# Altium footprint library USB to RS232.PcbLib: 20 footprints (part 1 of 2)
Each footprint in its own frame and in the unit in brackets; x right, y up, seen from the top. Pads: shape width x height; smd on the part's side, far side on the other; paste and mask are expansions set on the pad; w line width, h text height; cw(c..) or ccw(c..) is an arc to the next point about the centre after c.
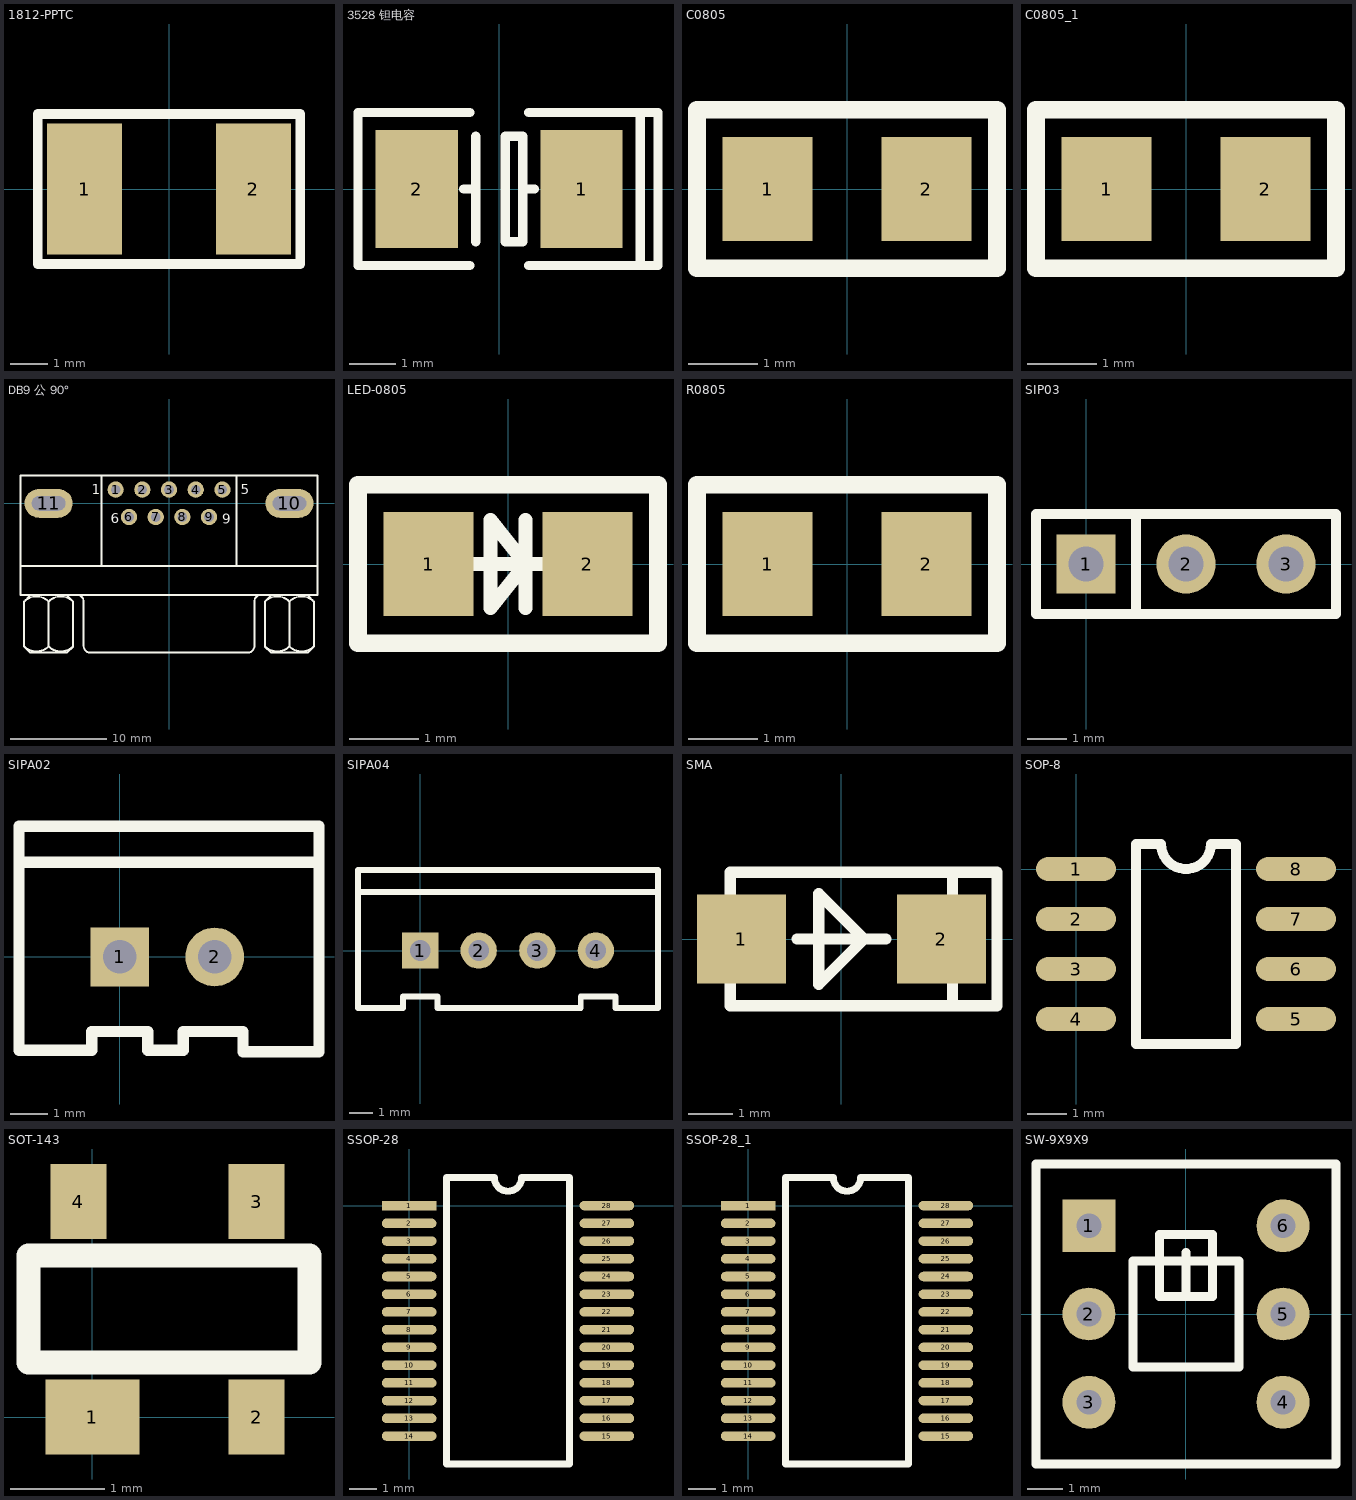
[diagram p0: the footprints below, top view; thin cyan lines are the x and y axes]

## 1812-PPTC [mm]
height 1
pads (2):
  rect 2x3.5 smd: 1(-2.25,0) 2(2.25,0)
Top Overlay:
  lines w0.254: -3.5,-2 3.5,-2 3.5,2 -3.5,2 -3.5,-2
3D body "User Library-fuse1812.STEP": height 1.32, standoff 0, extent -2.41,-1.61 2.41,1.61

## 3528 钽电容 [mil]
height 118.11
pads (2):
  rect 70x100 smd: 1(70,0) 2(-70,0)
Top Overlay:
  lines w8: -30,0 -20,0 ; -25,-65 -120,-65 -120,65 -25,65 ; -20,-45 -20,45 ; 20,0 30,0 ; 25,-65 120,-65 ; 25,65 120,65 ; 120,-65 120,65 ; 120,-65 135,-65 135,65 120,65 ; 5,-45 5,45 20,45 20,-45 5,-45
3D body "3528.STEP": height 82.22, standoff -0.46, extent -72.65,-55.51 72.64,55.51

## C0805 [mm]
height 0.5
pads (2):
  rect 1.3x1.5 smd: 1(-1.143,0) 2(1.143,0)
Top Overlay:
  lines w0.254: -2.159,-1.143 2.159,-1.143 2.159,0.508 2.159,1.143 -2.159,1.143 -2.159,0.635 -2.159,-1.143
3D body "User Library-Chip Cap_MLCC_0805 (2012)_A.STEP": height 0.6, standoff 0, extent -1,-0.625 1,0.625

## C0805_1 [mm]
height 0.5
pads (2):
  rect 1.3x1.5 smd: 1(-1.143,0) 2(1.143,0)
Top Overlay:
  lines w0.254: -2.159,-1.143 2.159,-1.143 2.159,0.508 2.159,1.143 -2.159,1.143 -2.159,0.635 -2.159,-1.143
3D body "User Library-Chip Cap_MLCC_0805 (2012)_A.STEP": height 0.6, standoff 0, extent -1,-0.625 1,0.625

## DB9 公 90° [mm]
height 12.5
pads (11):
  round 1.69 hole 1: 1(-5.54,1.42) 2(-2.77,1.42) 3(0,1.42) 4(2.77,1.42) 5(5.54,1.42) 6(-4.155,-1.42) 7(-1.385,-1.42) 8(1.385,-1.42) 9(4.155,-1.42)
  oval 5x3 hole 1.5 slot 3.5 at 0 deg: 10(12.495,0) 11(-12.495,0)
Top Overlay:
  lines w0.2: -15.4,-6.5 15.4,-6.5 ; -15.042,-14.865 -14.407,-15.5 -10.597,-15.5 -9.962,-14.865 ; -15.042,-14.85 -15.042,-10.199 -14.407,-9.564 ; -15.042,-13.798 -15.042,-13.586 ; -12.502,-14.85 -12.502,-10.199 ; -10.597,-9.564 -9.962,-10.199 -9.962,-14.85 ; -9.56,-9.505 cw(c-9.56,-10.2) -8.865,-10.2 -8.865,-14.8 ; -8.86,-14.805 ccw(c-8.165,-14.805) -8.165,-15.5 8.165,-15.5 ccw(c8.165,-14.805) 8.86,-14.805 ; -7,-6.5 -7,2.9 ; 7,-6.5 7,2.9 ; 8.865,-14.8 8.865,-10.2 cw(c9.56,-10.2) 9.56,-9.505 ; 9.958,-14.865 10.593,-15.5 14.403,-15.5 15.038,-14.865 ; 9.958,-14.85 9.958,-10.199 10.593,-9.564 ; 9.958,-13.798 9.958,-13.586 ; 12.498,-14.85 12.498,-10.199 ; 14.403,-9.564 15.038,-10.199 15.038,-14.85 ; -15.4,-9.5 -15.4,2.9 15.4,2.9 15.4,-9.5 -15.4,-9.5
  lines w0.203: -15.044,-10.197 cw(c-13.772,-11.469) -12.5,-10.197 ; -15.042,-14.85 ccw(c-13.77,-13.578) -12.498,-14.85 ; -12.507,-14.85 ccw(c-11.234,-13.578) -9.962,-14.85 ; -12.504,-10.197 cw(c-11.232,-11.469) -9.96,-10.197 ; 9.956,-10.197 cw(c11.228,-11.469) 12.5,-10.197 ; 9.958,-14.85 ccw(c11.23,-13.578) 12.502,-14.85 ; 12.493,-14.85 ccw(c13.766,-13.578) 15.038,-14.85 ; 12.496,-10.197 cw(c13.768,-11.469) 15.04,-10.197
  text "6" at -6.04,-2.08 h1.02
  text "1" at -8.04,0.92 h1.02
  text "5" at 7.46,0.92 h1.02
  text "9" at 5.54,-2.13 h1.02
3D body "DRB-9M.STEP": height 12.75, standoff -3.65, extent -15.25,-14.525 15.25,3.175

## LED-0805 [mm]
pads (2):
  rect 1.3x1.5 smd: 1(-1.143,0) 2(1.143,0)
Top Overlay:
  lines w0.203: -0.508,0 0.508,0 ; 0.254,-0.635 0.254,0.635 ; -0.254,-0.635 0.254,0 -0.254,0.635 -0.254,-0.635
  lines w0.254: -2.159,-1.143 2.159,-1.143 2.159,1.143 -2.159,1.143 -2.159,-1.143
3D body "User Library-LED SMD0805.STEP": height 0.85, standoff 0.01, extent -1.042,-0.453 1.021,0.453

## R0805 [mm]
height 0.5
pads (2):
  rect 1.3x1.5 smd: 1(-1.143,0) 2(1.143,0)
Top Overlay:
  lines w0.254: -2.159,-1.143 -2.159,0.635 -2.159,1.143 2.159,1.143 2.159,0.508 2.159,-1.143 -2.159,-1.143
3D body "R0805.STEP": height 0.55, standoff 0, extent -1,-0.63 1,0.63

## SIP03 [mm]
pads (3):
  rect 1.5x1.5 hole 0.9: 1(0,0)
  round 1.5 hole 0.9: 2(2.54,0) 3(5.08,0)
Top Overlay:
  lines w0.254: 1.27,-1.27 1.27,1.27 ; -1.27,-1.27 6.35,-1.27 6.35,1.27 -1.27,1.27 -1.27,-1.27
3D body "1001-3.STEP": height 8.54, standoff -3, extent -1.27,-1.27 6.35,1.27

## SIPA02 [mil]
pads (2):
  rect 62x62 hole 35.43: 1(0,0)
  round 62 hole 35.43: 2(100,0)
Top Overlay:
  lines w11.81: -106.3,-98.42 -29.53,-98.42 -29.53,-78.74 29.53,-78.74 29.53,-98.42 66.93,-98.42 ; 70.87,-78.74 66.93,-82.68 66.93,-86.61 66.93,-98.42 ; 210,-100 129.92,-100 129.92,-78.74 66.93,-78.74 66.93,-98.42
  lines w12: -106.3,-98.42 -106.3,137.79 210,137.79 ; -106.3,100 204.49,100 ; 210,-100 210,136.22
3D body "User Library-B2B-XH-A.STEP": height 279.53, standoff -129.92, extent -95.66,-92.51 195.68,133.87

## SIPA04 [mil]
pads (4):
  rect 62x62 hole 35.43: 1(0,0)
  round 62 hole 35.43: 2(100,0) 3(200,0) 4(300,0)
Top Overlay:
  lines w10: -102.48,100 -6.3,100 404.72,100 ; 404.72,137.79 -6.3,137.79 -106.3,137.79 -106.3,-98.42 -29.53,-98.42 -29.53,-78.74 29.53,-78.74 29.53,-98.42 174.41,-98.42 274.41,-98.42 274.41,-78.74 333.46,-78.74 333.46,-98.42 406.3,-98.42 406.3,137.79
3D body "User Library-B4B-XH-A.STEP": height 279.53, standoff -129.92, extent -94.09,-92.36 394.1,134.02

## SMA [mm]
height 2
pads (2):
  rect 2x2 smd: 1(-2.25,0) 2(2.25,0)
Top Overlay:
  lines w0.254: -2.5,-1 -2.5,-1.5 2.5,-1.5 ; -2.5,1 -2.5,1.5 2.5,1.5 ; -1,0 1,0 ; 2.5,-1 2.5,-1.5 ; 2.5,1 2.5,1.5 ; 2.5,-1.5 3.5,-1.5 3.5,1.5 2.5,1.5 ; -0.508,-1.016 0.508,0 -0.508,1.016 -0.508,-1.016
3D body "User Library-DO-214AC_SMA.STEP": height 2.15, standoff -0.05, extent -2.5,-1.35 2.5,1.35

## SOP-8 [mil]
height 39.37
pads (8):
  oval 80x24 smd: 1(0,0) 2(0,-50) 3(0,-100) 4(0,-150) 5(220,-150) 6(220,-100) 7(220,-50) 8(220,0)
Top Overlay:
  lines w10: 60,-175 60,25 85,25 ccw(c110,25) 135,25 160,25 160,-175 60,-175
3D body "User Library-so-8.step": height 73.87, standoff -1.02, extent -14.77,-173.25 234.78,23.75

## SOT-143 [mm]
pads (4):
  rect 1x0.8 smd: 1(0,0)
  rect 0.6x0.8 smd: 2(1.75,0) 3(1.75,2.3) 4(-0.15,2.3)
Top Overlay:
  lines w0.254: -0.683,0.583 -0.683,1.726 2.317,1.726 2.317,0.583 -0.683,0.583
3D body "User Library-SOT-143.step": height 1, standoff 0, extent -0.66,-0.06 2.26,2.36

## SSOP-28 [mm]
pads (28):
  rect 2x0.35 smd: 1(0,0)
  oval 2x0.35 smd: 2(0,-0.65) 3(0,-1.3) 4(0,-1.95) 5(0,-2.6) 6(0,-3.25) 7(0,-3.9) 8(0,-4.55) 9(0,-5.2) 10(0,-5.85) 11(0,-6.5) 12(0,-7.15) 13(0,-7.8) 14(0,-8.45) 15(7.25,-8.45) 16(7.25,-7.8) 17(7.25,-7.15) 18(7.25,-6.5) 19(7.25,-5.85) 20(7.25,-5.2) 21(7.25,-4.55) 22(7.25,-3.9) 23(7.25,-3.25) 24(7.25,-2.6) 25(7.25,-1.95) 26(7.25,-1.3) 27(7.25,-0.65) 28(7.25,0)
Top Overlay:
  lines w0.254: 1.375,-9.475 5.875,-9.475 5.875,1.025 4.125,1.025 cw(c3.625,1.025) 3.625,0.525 cw(c3.625,1.025) 3.125,1.025 1.375,1.025 1.375,-9.475
3D body "SSOP-28.STEP": height 2.15, standoff 0, extent -0.253,-9.39 7.503,0.94

## SSOP-28_1 [mm]
pads (28):
  rect 2x0.35 smd: 1(0,0)
  oval 2x0.35 smd: 2(0,-0.65) 3(0,-1.3) 4(0,-1.95) 5(0,-2.6) 6(0,-3.25) 7(0,-3.9) 8(0,-4.55) 9(0,-5.2) 10(0,-5.85) 11(0,-6.5) 12(0,-7.15) 13(0,-7.8) 14(0,-8.45) 15(7.25,-8.45) 16(7.25,-7.8) 17(7.25,-7.15) 18(7.25,-6.5) 19(7.25,-5.85) 20(7.25,-5.2) 21(7.25,-4.55) 22(7.25,-3.9) 23(7.25,-3.25) 24(7.25,-2.6) 25(7.25,-1.95) 26(7.25,-1.3) 27(7.25,-0.65) 28(7.25,0)
Top Overlay:
  lines w0.254: 1.375,-9.475 1.375,1.025 3.125,1.025 ccw(c3.625,1.025) 3.625,0.525 ccw(c3.625,1.025) 4.125,1.025 5.875,1.025 5.875,-9.475 1.375,-9.475
3D body "SSOP-28.STEP": height 2.15, standoff 0, extent -0.253,-9.39 7.503,0.94

## SW-9X9X9 [mm]
pads (6):
  rect 1.5x1.5 hole 0.7: 1(-2.75,2.5)
  round 1.5 hole 0.7: 2(-2.75,0) 3(-2.75,-2.5) 4(2.75,-2.5) 5(2.75,0) 6(2.75,2.5)
Top Overlay:
  lines w0.254: 0,0.5 0,1.75 ; -4.25,-4.25 -4.25,4.25 4.25,4.25 4.25,-4.25 -4.25,-4.25 ; -1.5,-1.5 1.5,-1.5 1.5,1.5 -1.5,1.5 -1.5,-1.5 ; -0.75,0.5 -0.75,2.25 0.75,2.25 0.75,0.5 -0.5,0.5 -0.75,0.5
3D body "User Library-PSM1-0-0.STEP": height 3, standoff -14, extent -4,-4 4,4